# Altium footprint library Wurth_Elektronik_Electromechanic_Wire_to_Board_Connectors_rev16a.PCBLIB: 662 footprints (part 40 of 42)
Each footprint in its own frame and in the unit in brackets; x right, y up, seen from the top. Pads: shape width x height; smd on the part's side, far side on the other; paste and mask are expansions set on the pad; w line width, h text height; cw(c..) or ccw(c..) is an arc to the next point about the centre after c.
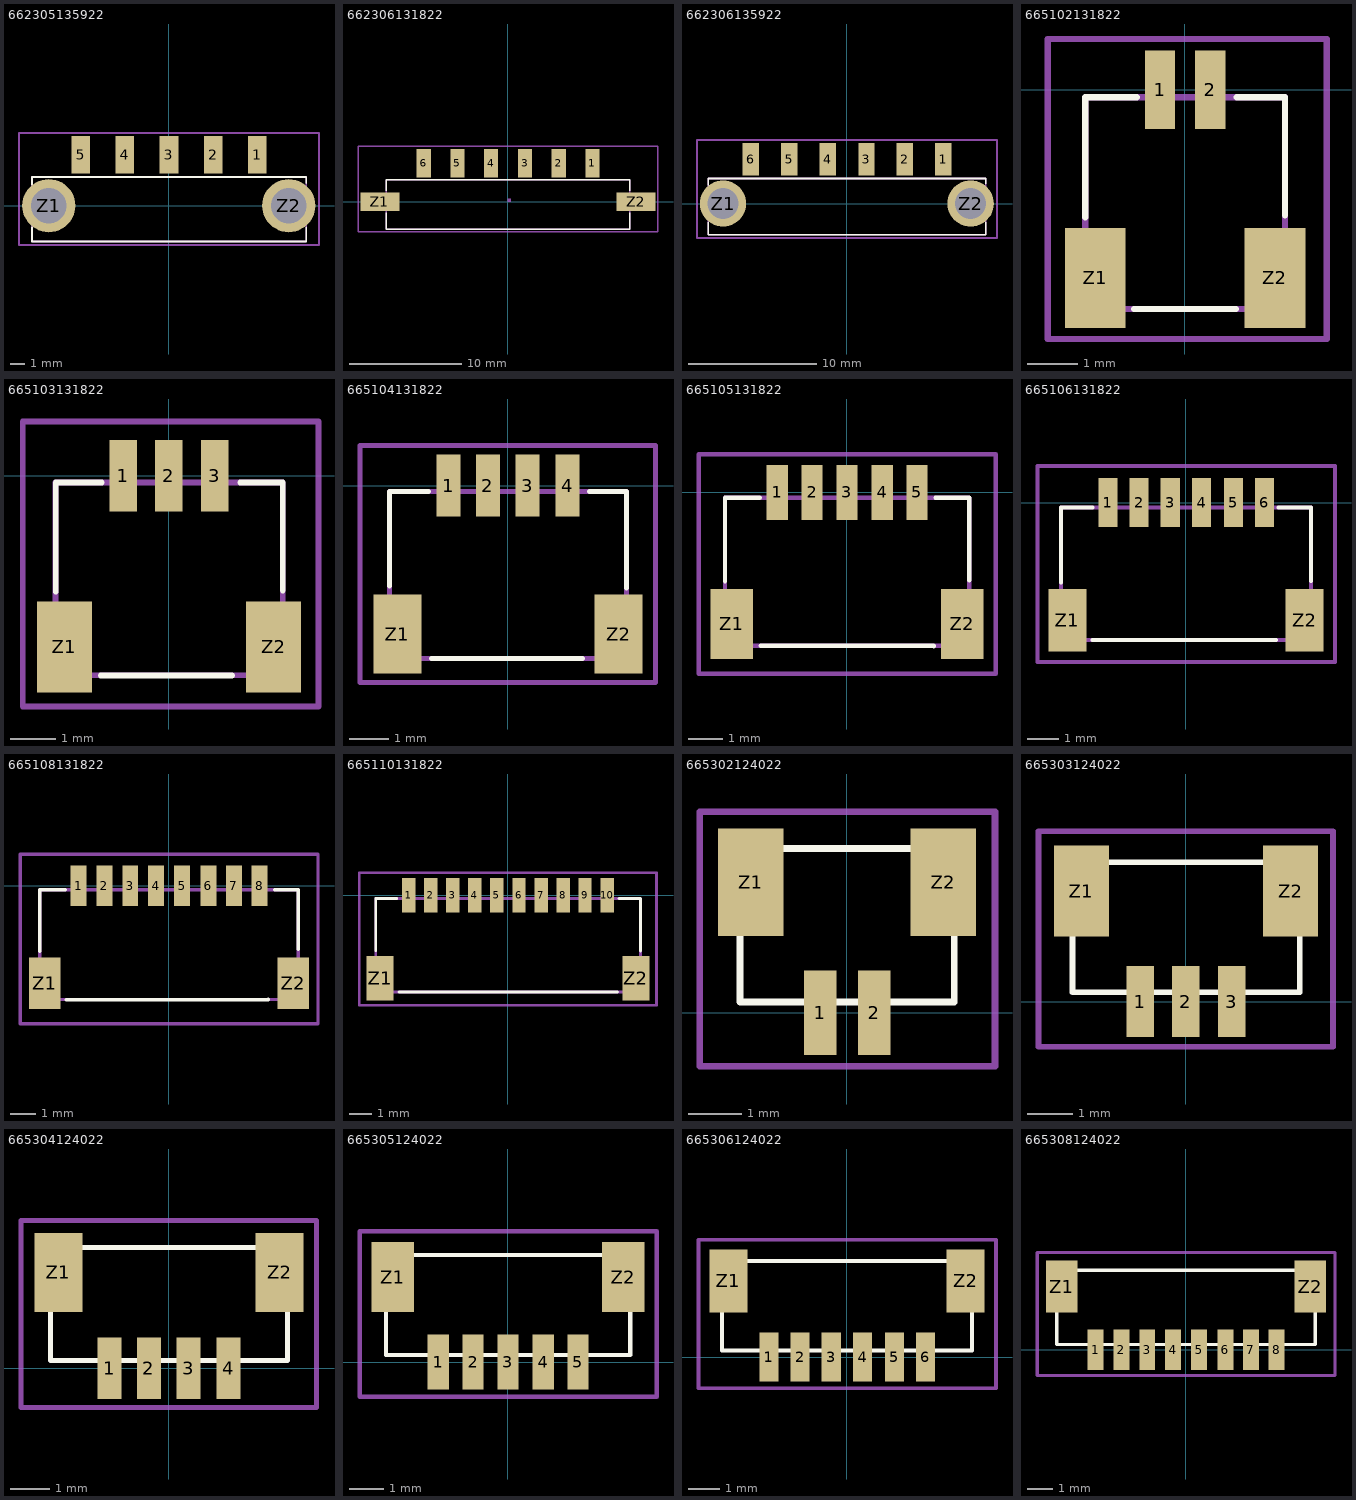
[diagram p39: the footprints below, top view; thin cyan lines are the x and y axes]

## 662305135922 [mil]
pads (7):
  rect 50x100 smd: 1(237,136) 2(119,136) 3(0,136) 4(-118.11,136) 5(-236.22,136)
  round 142.5 hole 95: Z1(-321.65,0) Z2(321,0)
Top Overlay:
  lines w5: -367.13,-57.87 -367.13,-95.87 368,-95.87 368,-57.87 ; -367.13,57 -367.13,77 367,77 ; 368,61 368,77
Mechanical 2:
  text ">Name" at -153.54,222 h77.5
Mechanical 4:
  text ">Value" at -129.92,-175.98 h77.5
Mechanical 16:
  lines w5: -367.13,-95.87 -367.13,77 368,77 368,-95.87 -367.13,-95.87
Mechanical 27:
  lines w5: -401.57,-105.71 402,-105.71 402,195 -401.57,195 -401.57,-105.71

## 662306131822 [mil]
pads (8):
  rect 50x100 smd: 1(296,135) 2(178,135) 3(60,135) 4(-59.06,135) 5(-177.17,135) 6(-295.28,135)
  rect 136x65 smd: Z1(-448.62,0) Z2(449,0)
Top Overlay:
  lines w5: -426.18,-38.58 -426.18,-95.87 427,-95.87 427,-38.58 ; -426.18,39 -426.18,77 427,77 427,39
Mechanical 2:
  text ">Name" at -133.86,222 h77.5
Mechanical 4:
  text ">Value" at -129.92,-176.38 h77.5
Mechanical 10:
  region: 0,0 10,0 10,10 0,10
Mechanical 16:
  lines w5: -426.18,-95.87 -426.18,77 427,77 427,-95.87 -426.18,-95.87
Mechanical 27:
  lines w5: -525.59,-105.71 526,-105.71 526,195 -525.59,195 -525.59,-105.71

## 662306135922 [mil]
pads (8):
  rect 50x100 smd: 1(296,136) 2(178,136) 3(60,136) 4(-59.06,136) 5(-177.17,136) 6(-295.28,136)
  round 142.5 hole 95: Z1(-380.71,0) Z2(380,0)
Top Overlay:
  lines w5: -426.18,-57.87 -426.18,-95.87 427,-95.87 427,-57.87 ; -426.18,57 -426.18,77 427,77 427,61
Mechanical 2:
  text ">Name" at -94.49,222 h77.5
Mechanical 4:
  text ">Value" at -106.3,-183.86 h77.5
Mechanical 16:
  lines w5: -426.18,-95.87 -426.18,77 427,77 427,-95.87 -426.18,-95.87
Mechanical 27:
  lines w5: -460.63,-105.71 461,-105.71 461,195 -460.63,195 -460.63,-105.71

## 665102131822 [mil]
pads (4):
  rect 24x62 smd: 1(-19.68,0) 2(20,0)
  rect 48x79 smd: Z1(-70.87,-148.62) Z2(71,-148.62)
Top Overlay:
  lines w5: -78.74,-100.79 -78.74,-5.91 -38.19,-5.91 ; -40.16,-173.23 40,-173.23 ; 41,-5.91 79,-5.91 79,-99.21
Mechanical 2:
  text ">NAME" at -78.74,98 h77.5
Mechanical 4:
  text ">VALUE" at -78.74,-255.91 h77.5
Mechanical 16:
  lines w5: -78.74,-173.23 -78.74,-5.91 79,-5.91 79,-173.23 -78.74,-173.23
Mechanical 27:
  lines w5: -108.27,-196.85 -108.27,40 112,40 112,-196.85 109,-196.85 -108.27,-196.85

## 665103131822 [mil]
pads (5):
  rect 24x62 smd: 1(-39.37,0) 2(0,0) 3(40,0)
  rect 48x79 smd: Z1(-90.55,-148.62) Z2(91,-148.62)
Top Overlay:
  lines w5: -98.03,-100.79 -98.03,-5.91 -58.27,-5.91 ; -59.06,-173.62 55,-173.62 ; 62,-5.91 99,-5.91 99,-99.61
Mechanical 2:
  text ">NAME" at -98.43,98 h77.5
Mechanical 4:
  text ">VALUE" at -98.43,-255.91 h77.5
Mechanical 16:
  lines w5: -98.43,-173.23 -98.43,-5.91 99,-5.91 99,-173.23 -98.43,-173.23
Mechanical 27:
  lines w5: -126.77,-200.39 -126.77,47 130,47 130,-200.39 -126.77,-200.39

## 665104131822 [mil]
pads (6):
  rect 24x62 smd: 1(-59.06,0) 2(-19.68,0) 3(20,0) 4(60,0)
  rect 48x79 smd: Z1(-110.24,-148.62) Z2(111,-148.62)
Top Overlay:
  lines w5: -118.11,-100.39 -118.11,-5.91 -79.13,-5.91 ; -75.98,-173.23 75,-173.23 ; 82,-5.91 119,-5.91 119,-102.36
Mechanical 2:
  text ">NAME" at -118.11,68 h77.5
Mechanical 4:
  text ">VALUE" at -118.11,-255.91 h77.5
Mechanical 16:
  lines w5: -118.11,-173.23 -118.11,-5.91 119,-5.91 119,-173.23 -118.11,-173.23
Mechanical 27:
  lines w5: -147.64,-196.85 -147.64,40 148,40 148,-196.85 -147.64,-196.85

## 665105131822 [mil]
pads (7):
  rect 24x62 smd: 1(-78.74,0) 2(-39.37,0) 3(0,0) 4(40,0) 5(79,0)
  rect 48x79 smd: Z1(-129.92,-148.62) Z2(130,-148.62)
Top Overlay:
  lines w5: -137.8,-100.39 -137.8,-5.91 -98.43,-5.91 ; -97.64,-173.23 98,-173.23 98,-173.62 ; 100,-5.91 138,-5.91 138,-99.21
Mechanical 2:
  text ">NAME" at -137.8,98 h77.5
Mechanical 4:
  text ">VALUE" at -138.98,-275.59 h77.5
Mechanical 16:
  lines w5: -137.8,-173.23 -137.8,-5.91 138,-5.91 138,-173.23 -137.8,-173.23
Mechanical 27:
  lines w5: -167.32,-204.72 -167.32,43 168,43 168,-204.72 -167.32,-204.72

## 665106131822 [mil]
pads (8):
  rect 24x62 smd: 1(-98.43,0) 2(-59.06,0) 3(-19.68,0) 4(20,0) 5(60,0) 6(99,0)
  rect 48x79 smd: Z1(-149.61,-148.62) Z2(150,-148.62)
Top Overlay:
  lines w5: -157.48,-100.79 -157.48,-5.91 -117.72,-5.91 ; -118.11,-173.23 114,-173.23 ; 117,-5.91 158,-5.91 158,-98.82
Mechanical 2:
  text ">NAME" at -157.48,98 h77.5
Mechanical 4:
  text ">VALUE" at -155.51,-266.93 h77.5
Mechanical 16:
  lines w5: -157.48,-173.23 -157.48,-5.91 158,-5.91 158,-173.23 -157.48,-173.23
Mechanical 27:
  lines w5: -187.01,-200.79 -187.01,46 188,46 188,-200.79 -187.01,-200.79

## 665108131822 [mil]
pads (10):
  rect 24x62 smd: 1(-137.8,0) 2(-98.43,0) 3(-59.06,0) 4(-19.68,0) 5(20,0) 6(60,0) 7(99,0) 8(138,0)
  rect 48x79 smd: Z1(-188.98,-148.62) Z2(189,-148.62)
Top Overlay:
  lines w5: -196.85,-100 -196.85,-5.91 -157.87,-5.91 ; -156.69,-173.62 151,-173.62 151,-172.83 ; 161,-5.91 197,-5.91 197,-97.24
Mechanical 2:
  text ">NAME" at -196.85,78 h77.5
Mechanical 4:
  text ">VALUE" at -188.98,-282.68 h77.5
Mechanical 16:
  lines w5: -196.85,-173.23 -196.85,-5.91 197,-5.91 197,-173.23 -196.85,-173.23
Mechanical 27:
  lines w5: -226.38,-210.24 -226.38,48 227,48 227,-210.24 -226.38,-210.24

## 665110131822 [mil]
pads (12):
  rect 24x62 smd: 1(-177.17,0) 2(-137.8,0) 3(-98.43,0) 4(-59.06,0) 5(-19.68,0) 6(20,0) 7(60,0) 8(99,0) 9(138,0) 10(178,0)
  rect 48x79 smd: Z1(-228.35,-148.62) Z2(229,-148.62)
Top Overlay:
  lines w5: -236.22,-98.82 -236.22,-5.91 -198.43,-5.91 ; -194.49,-173.23 196,-173.23 ; 199,-5.91 237,-5.91 237,-100
Mechanical 2:
  text ">NAME" at -236.22,67 h77.5
Mechanical 4:
  text ">VALUE" at -236.22,-255.91 h77.5
Mechanical 16:
  lines w5: -236.22,-173.23 -236.22,-5.91 237,-5.91 237,-173.23 -236.22,-173.23
Mechanical 27:
  lines w5: -265.75,-196.85 -265.75,40 266,40 266,-196.85 -265.75,-196.85

## 665302124022 [mil]
pads (4):
  rect 24x62 smd: 1(-19.68,0) 2(20,0)
  rect 48x79 smd: Z1(-70.87,96) Z2(71,96)
Top Overlay:
  lines w5: -78.74,8 -78.74,121 79,121 79,8 -78.74,8
Mechanical 2:
  text ">NAME" at -78.74,178 h77.5
Mechanical 4:
  text ">VALUE" at -78.74,-98.43 h77.5
Mechanical 27:
  lines w5: -108.27,-39.37 -108.27,148 109,148 109,-39.37 -108.27,-39.37

## 665303124022 [mil]
pads (5):
  rect 24x62 smd: 1(-39.37,0) 2(0,0) 3(40,0)
  rect 48x79 smd: Z1(-90.55,96) Z2(91,96)
Top Overlay:
  lines w5: -98.43,8 -98.43,121 99,121 99,8 -98.43,8
Mechanical 2:
  text ">NAME" at -98.43,178 h77.5
Mechanical 4:
  text ">VALUE" at -98.43,-98.43 h77.5
Mechanical 27:
  lines w5: -127.95,-39.37 -127.95,148 128,148 128,-39.37 -127.95,-39.37

## 665304124022 [mil]
pads (6):
  rect 24x62 smd: 1(-59.06,0) 2(-19.68,0) 3(20,0) 4(60,0)
  rect 48x79 smd: Z1(-110.24,96) Z2(111,96)
Top Overlay:
  lines w5: -118.11,8 -118.11,121 119,121 119,8 -118.11,8
Mechanical 2:
  text ">NAME" at -118.11,178 h77.5
Mechanical 4:
  text ">VALUE" at -118.11,-98.43 h77.5
Mechanical 27:
  lines w5: -147.64,-39.37 -147.64,148 148,148 148,-39.37 -147.64,-39.37

## 665305124022 [mil]
pads (7):
  rect 24x62 smd: 1(-78.74,0) 2(-39.37,0) 3(0,0) 4(40,0) 5(79,0)
  rect 48x79 smd: Z1(-129.92,96) Z2(130,96)
Top Overlay:
  lines w5: -137.8,8 -137.8,121 138,121 138,8 -137.8,8
Mechanical 2:
  text ">NAME" at -137.8,178 h77.5
Mechanical 4:
  text ">VALUE" at -137.8,-98.43 h77.5
Mechanical 27:
  lines w5: -167.32,-39.37 -167.32,148 168,148 168,-39.37 -167.32,-39.37

## 665306124022 [mil]
pads (8):
  rect 24x62 smd: 1(-98.43,0) 2(-59.06,0) 3(-19.68,0) 4(20,0) 5(60,0) 6(99,0)
  rect 48x79 smd: Z1(-149.61,96) Z2(150,96)
Top Overlay:
  lines w5: -157.48,8 -157.48,121 158,121 158,8 -157.48,8
Mechanical 2:
  text ">NAME" at -157.48,178 h77.5
Mechanical 4:
  text ">VALUE" at -157.48,-98.43 h77.5
Mechanical 27:
  lines w5: -187.01,-39.37 -187.01,148 188,148 188,-39.37 -187.01,-39.37

## 665308124022 [mil]
pads (10):
  rect 24x62 smd: 1(-137.8,0) 2(-98.43,0) 3(-59.06,0) 4(-19.68,0) 5(20,0) 6(60,0) 7(99,0) 8(138,0)
  rect 48x79 smd: Z1(-188.98,96) Z2(189,96)
Top Overlay:
  lines w5: -196.85,8 -196.85,121 197,121 197,8 -196.85,8
Mechanical 2:
  text ">NAME" at -196.85,178 h77.5
Mechanical 4:
  text ">VALUE" at -196.85,-98.43 h77.5
Mechanical 27:
  lines w5: -226.38,-39.37 -226.38,148 227,148 227,-39.37 -226.38,-39.37